# Altium footprint library Connectors THD.PcbLib: 631 footprints (part 12 of 46) (continued)
## ERNI_004500 [mm] "Connector; DIN 41612, Type R/3, Thru-Hole; Rows a+b+c, 30 Male Contacts"
height 11.5
pads (32):
  round 1.5 hole 1: a1(0,0) a2(0,-2.54) a3(0,-5.08) a4(0,-7.62) a5(0,-10.16) a6(0,-12.7) a7(0,-15.24) a8(0,-17.78) a9(0,-20.32) a10(0,-22.86) b1(2.54,0) b2(2.54,-2.54) b3(2.54,-5.08) b4(2.54,-7.62) b5(2.54,-10.16) b6(2.54,-12.7) b7(2.54,-15.24) b8(2.54,-17.78) b9(2.54,-20.32) b10(2.54,-22.86) c1(5.08,0) c2(5.08,-2.54) c3(5.08,-5.08) c4(5.08,-7.62) c5(5.08,-10.16) c6(5.08,-12.7) c7(5.08,-15.24) c8(5.08,-17.78) c9(5.08,-20.32) c10(5.08,-22.86)
  round 3.5 / inner round 3.5 / far side round 5.1 hole 2.8: MTG1(2.24,5.95) MTG2(2.24,-28.81)
Top Overlay:
  lines w0.2: -2.96,-27.479 -0.76,-27.479 ; -2.96,4.619 -0.76,4.619 ; -0.76,-31.309 -0.76,-27.479 ; -0.76,-26.679 -2.41,-26.679 ; -0.76,3.819 -2.41,3.819 ; -0.76,8.449 -0.76,4.619 ; 4.39,-26.314 4.39,-25.079 6.89,-25.079 ; 4.39,-25.679 4.99,-25.679 7.49,-25.679 ; 4.39,2.819 4.99,2.819 7.49,2.819 ; 4.39,3.454 4.39,2.219 6.89,2.219 ; 5.24,-31.309 5.24,-27.309 ccw(c4.24,-27.309) 4.24,-26.309 0.24,-26.309 ccw(c0.24,-27.309) -0.76,-27.309 ; 5.24,-27.479 8.04,-27.479 ; 5.24,4.619 8.04,4.619 ; 5.24,8.449 5.24,4.449 cw(c4.24,4.449) 4.24,3.449 0.24,3.449 cw(c0.24,4.449) -0.76,4.449 ; -2.41,-26.679 -1.81,-26.079 ; -2.41,-26.679 -2.41,3.819 ; -2.41,3.819 -1.81,3.219 ; -1.81,-26.079 -0.76,-26.079 -0.76,-27.309 ; -1.81,-26.079 -1.81,3.219 ; -1.81,3.219 -0.76,3.219 -0.76,4.449 ; -0.76,-27.479 -0.76,-27.309 ; -0.76,4.449 -0.76,4.619 ; 6.89,-25.079 6.89,2.219 ; 6.89,-25.079 7.49,-25.679 ; 6.89,2.219 7.49,2.819 ; 7.49,-25.679 7.49,2.819 ; -2.96,-31.309 -2.96,8.449 8.04,8.449 8.04,-31.309 -2.96,-31.309
  text "b" at 2.032,1.524 h1.2
  text "a" at -0.508,1.524 h1.2
  text "5" at -4.174,-10.885 h1.2
  text "10" at -5.172,-23.535 h1.2
  text "1" at -3.839,-0.725 h1.2
Mechanical 8:
  lines w0.1: -1,-22.86 0,-22.86 ; -1,-20.32 0,-20.32 ; -1,-17.78 0,-17.78 ; -1,-15.24 0,-15.24 ; -1,-12.7 0,-12.7 ; -1,-10.16 0,-10.16 ; -1,-7.62 0,-7.62 ; -1,-5.08 0,-5.08 ; -1,-2.54 0,-2.54 ; -1,0 0,0 ; 0,-23.86 0,-22.86 ; 0,-21.86 0,-22.86 ; 0,-21.32 0,-20.32 ; 0,-19.32 0,-20.32 ; 0,-18.78 0,-17.78 ; 0,-16.78 0,-17.78 ; 0,-16.24 0,-15.24 ; 0,-14.24 0,-15.24 ; 0,-13.7 0,-12.7 ; 0,-11.7 0,-12.7 ; 0,-11.16 0,-10.16 ; 0,-9.16 0,-10.16 ; 0,-8.62 0,-7.62 ; 0,-6.62 0,-7.62 ; 0,-6.08 0,-5.08 ; 0,-4.08 0,-5.08 ; 0,-3.54 0,-2.54 ; 0,-1.54 0,-2.54 ; 0,-1 0,0 ; 0,1 0,0 ; 1,-22.86 0,-22.86 ; 1,-20.32 0,-20.32 ; 1,-17.78 0,-17.78 ; 1,-15.24 0,-15.24 ; 1,-12.7 0,-12.7 ; 1,-10.16 0,-10.16 ; 1,-7.62 0,-7.62 ; 1,-5.08 0,-5.08 ; 1,-2.54 0,-2.54 ; 1,0 0,0 ; 1.24,-28.81 2.24,-28.81 ; 1.24,5.95 2.24,5.95 ; 1.54,-22.86 2.54,-22.86 ; 1.54,-20.32 2.54,-20.32 ; 1.54,-17.78 2.54,-17.78 ; 1.54,-15.24 2.54,-15.24 ; 1.54,-12.7 2.54,-12.7 ; 1.54,-10.16 2.54,-10.16 ; 1.54,-7.62 2.54,-7.62 ; 1.54,-5.08 2.54,-5.08 ; 1.54,-2.54 2.54,-2.54 ; 1.54,0 2.54,0 ; 2.24,-29.81 2.24,-28.81 ; 2.24,-27.81 2.24,-28.81 ; 2.24,4.95 2.24,5.95 ; 2.24,6.95 2.24,5.95 ; 2.54,-23.86 2.54,-22.86 ; 2.54,-21.86 2.54,-22.86 ; 2.54,-21.32 2.54,-20.32 ; 2.54,-19.32 2.54,-20.32 ; 2.54,-18.78 2.54,-17.78 ; 2.54,-16.78 2.54,-17.78 ; 2.54,-16.24 2.54,-15.24 ; 2.54,-14.24 2.54,-15.24 ; 2.54,-13.7 2.54,-12.7 ; 2.54,-11.7 2.54,-12.7 ; 2.54,-11.16 2.54,-10.16 ; 2.54,-9.16 2.54,-10.16 ; 2.54,-8.62 2.54,-7.62 ; 2.54,-6.62 2.54,-7.62 ; 2.54,-6.08 2.54,-5.08 ; 2.54,-4.08 2.54,-5.08 ; 2.54,-3.54 2.54,-2.54 ; 2.54,-1.54 2.54,-2.54 ; 2.54,-1 2.54,0 ; 2.54,1 2.54,0 ; 3.24,-28.81 2.24,-28.81 ; 3.24,5.95 2.24,5.95 ; 3.54,-22.86 2.54,-22.86 ; 3.54,-20.32 2.54,-20.32 ; 3.54,-17.78 2.54,-17.78 ; 3.54,-15.24 2.54,-15.24 ; 3.54,-12.7 2.54,-12.7 ; 3.54,-10.16 2.54,-10.16 ; 3.54,-7.62 2.54,-7.62 ; 3.54,-5.08 2.54,-5.08 ; 3.54,-2.54 2.54,-2.54 ; 3.54,0 2.54,0 ; 4.08,-22.86 5.08,-22.86 ; 4.08,-20.32 5.08,-20.32 ; 4.08,-17.78 5.08,-17.78 ; 4.08,-15.24 5.08,-15.24 ; 4.08,-12.7 5.08,-12.7 ; 4.08,-10.16 5.08,-10.16 ; 4.08,-7.64 5.08,-7.64 ; 4.08,-5.08 5.08,-5.08 ; 4.08,-2.54 5.08,-2.54 ; 4.08,0 5.08,0 ; 5.08,-23.86 5.08,-22.86 ; 5.08,-21.86 5.08,-22.86 ; 5.08,-21.32 5.08,-20.32 ; 5.08,-19.32 5.08,-20.32 ; 5.08,-18.78 5.08,-17.78 ; 5.08,-16.78 5.08,-17.78 ; 5.08,-16.24 5.08,-15.24 ; 5.08,-14.24 5.08,-15.24 ; 5.08,-13.7 5.08,-12.7 ; 5.08,-11.7 5.08,-12.7 ; 5.08,-11.16 5.08,-10.16 ; 5.08,-9.16 5.08,-10.16 ; 5.08,-8.64 5.08,-7.64 ; 5.08,-6.64 5.08,-7.64 ; 5.08,-6.08 5.08,-5.08 ; 5.08,-4.08 5.08,-5.08 ; 5.08,-3.54 5.08,-2.54 ; 5.08,-1.54 5.08,-2.54 ; 5.08,-1 5.08,0 ; 5.08,1 5.08,0 ; 6.08,-22.86 5.08,-22.86 ; 6.08,-20.32 5.08,-20.32 ; 6.08,-17.78 5.08,-17.78 ; 6.08,-15.24 5.08,-15.24 ; 6.08,-12.7 5.08,-12.7 ; 6.08,-10.16 5.08,-10.16 ; 6.08,-7.64 5.08,-7.64 ; 6.08,-5.08 5.08,-5.08 ; 6.08,-2.54 5.08,-2.54 ; 6.08,0 5.08,0
Mechanical 14:
  circle w0.1: c2.24,5.949 r1.4
  circle w0.1: c2.24,-28.809 r1.4
  lines w0.1: -2.96,-27.479 -0.76,-27.479 ; -2.96,4.619 -0.76,4.619 ; -0.76,-31.309 -0.76,-27.479 ; -0.76,-26.679 -2.41,-26.679 ; -0.76,3.819 -2.41,3.819 ; -0.76,8.449 -0.76,4.619 ; 4.39,-26.314 4.39,-25.079 6.89,-25.079 ; 4.39,-25.679 4.99,-25.679 7.49,-25.679 ; 4.39,2.819 4.99,2.819 7.49,2.819 ; 4.39,3.454 4.39,2.219 6.89,2.219 ; 5.24,-31.309 5.24,-27.309 ccw(c4.24,-27.309) 4.24,-26.309 0.24,-26.309 ccw(c0.24,-27.309) -0.76,-27.309 ; 5.24,-27.479 8.04,-27.479 ; 5.24,4.619 8.04,4.619 ; 5.24,8.449 5.24,4.449 cw(c4.24,4.449) 4.24,3.449 0.24,3.449 cw(c0.24,4.449) -0.76,4.449 ; -2.41,-26.679 -1.81,-26.079 ; -2.41,-26.679 -2.41,3.819 ; -2.41,3.819 -1.81,3.219 ; -1.81,-26.079 -0.76,-26.079 -0.76,-27.309 ; -1.81,-26.079 -1.81,3.219 ; -1.81,3.219 -0.76,3.219 -0.76,4.449 ; -0.76,-27.479 -0.76,-27.309 ; -0.76,4.449 -0.76,4.619 ; 6.89,-25.079 6.89,2.219 ; 6.89,-25.079 7.49,-25.679 ; 6.89,2.219 7.49,2.819 ; 7.49,-25.679 7.49,2.819 ; -2.96,-31.309 -2.96,8.449 8.04,8.449 8.04,-31.309 -2.96,-31.309
  text "b" at 2.032,1.524 h1.2
  text "a" at -0.508,1.524 h1.2
  text "10" at -5.172,-23.535 h1.2
  text "1" at -3.839,-0.725 h1.2
  text "5" at -4.174,-10.885 h1.2
3D body: height 11.6, standoff -4.5, extent -2.96,-31.308 8.04,8.449

## ERNI_214443 [mm] "40+4 Contacts, 5 Rows  (a,b,c,d,e) of 8 positions + 1 Shield Row (f) of  4 Positions, Pitch 2 mm,  Press-Fit, Right Angle Ermet B8 CompactPCI Express Female Connector"
height 11.4
pads (44):
  round 1.1 hole 0.6: a1(4,7) a2(4,5) a3(4,3) a4(4,1) a5(4,-1) a6(4,-3) a7(4,-5) a8(4,-7) b1(2,7) b2(2,5) b3(2,3) b4(2,1) b5(2,-1) b6(2,-3) b7(2,-5) b8(2,-7) c1(0,7) c2(0,5) c3(0,3) c4(0,1) c5(0,-1) c6(0,-3) c7(0,-5) c8(0,-7) d1(-2,7) d2(-2,5) d3(-2,3) d4(-2,1) d5(-2,-1) d6(-2,-3) d7(-2,-5) d8(-2,-7) e1(-4,7) e2(-4,5) e3(-4,3) e4(-4,1) e5(-4,-1) e6(-4,-3) e7(-4,-5) e8(-4,-7) f1(-6,7) f3(-6,3) f5(-6,-1) f7(-6,-5)
Top Overlay:
  lines w0.2: -6.109,-5.944 -6.109,-7.915 -4.515,-7.915 ; -6.109,-4.056 -6.109,-1.944 ; -6.109,-0.056 -6.109,2.056 ; -6.109,3.944 -6.109,6.056 ; -5.849,-7.915 -5.849,-8 14.801,-8 14.801,8 -5.849,8 -5.849,7.915 ; -5.744,7.915 -4.515,7.915 ; -5.689,-7.915 -5.689,-5.898 ; -5.689,-4.102 -5.689,-1.898 ; -5.689,-0.102 -5.689,2.102 ; -5.689,3.898 -5.689,6.102 ; -5.689,7.898 -5.689,7.915 ; 4.515,-7.915 13.601,-7.915 13.601,-6.365 cw(c13.751,-6.365) 13.738,-6.216 14.218,-6.215 14.218,-5.715 13.751,-5.715 cw(c13.751,-5.565) 13.601,-5.565 13.601,-0.365 cw(c13.751,-0.365) 13.751,-0.215 14.218,-0.215 14.218,0.285 13.751,0.285 cw(c13.751,0.435) 13.601,0.435 13.601,5.635 cw(c13.751,5.635) 13.751,5.785 14.218,5.785 14.218,6.285 13.751,6.285 cw(c13.751,6.435) 13.601,6.435 13.601,7.915 4.515,7.915 ; 8.423,-7.49 ccw(c8.548,-7.49) 8.548,-7.615 12.701,-7.615 ccw(c12.701,-7.215) 13.101,-7.215 13.101,-6.715 ccw(c12.701,-6.715) 12.701,-6.315 8.548,-6.315 ccw(c8.548,-6.44) 8.423,-6.44 8.423,-6.565 12.701,-6.565 12.701,-7.365 8.423,-7.365 8.423,-7.49 ; 8.423,-5.49 ccw(c8.548,-5.49) 8.548,-5.615 12.701,-5.615 ccw(c12.701,-5.215) 13.101,-5.215 13.101,-4.715 ccw(c12.701,-4.715) 12.701,-4.315 8.548,-4.315 ccw(c8.548,-4.44) 8.423,-4.44 8.423,-4.565 12.701,-4.565 12.701,-5.365 8.423,-5.365 8.423,-5.49 ; 8.423,-3.49 ccw(c8.548,-3.49) 8.548,-3.615 12.701,-3.615 ccw(c12.701,-3.215) 13.101,-3.215 13.101,-2.715 ccw(c12.701,-2.715) 12.701,-2.315 8.548,-2.315 ccw(c8.548,-2.44) 8.423,-2.44 8.423,-2.565 12.701,-2.565 12.701,-3.365 8.423,-3.365 8.423,-3.49 ; 8.423,-1.49 ccw(c8.548,-1.49) 8.548,-1.615 12.701,-1.615 ccw(c12.701,-1.215) 13.101,-1.215 13.101,-0.715 ccw(c12.701,-0.715) 12.701,-0.315 8.548,-0.315 ccw(c8.548,-0.44) 8.423,-0.44 8.423,-0.565 12.701,-0.565 12.701,-1.365 8.423,-1.365 8.423,-1.49 ; 8.423,0.51 ccw(c8.548,0.51) 8.548,0.385 12.701,0.385 ccw(c12.701,0.785) 13.101,0.785 13.101,1.285 ccw(c12.701,1.285) 12.701,1.685 8.548,1.685 ccw(c8.548,1.56) 8.423,1.56 8.423,1.435 12.701,1.435 12.701,0.635 8.423,0.635 8.423,0.51 ; 8.423,2.51 ccw(c8.548,2.51) 8.548,2.385 12.701,2.385 ccw(c12.701,2.785) 13.101,2.785 13.101,3.285 ccw(c12.701,3.285) 12.701,3.685 8.548,3.685 ccw(c8.548,3.56) 8.423,3.56 8.423,3.435 12.701,3.435 12.701,2.635 8.423,2.635 8.423,2.51 ; 8.423,4.51 ccw(c8.548,4.51) 8.548,4.385 12.701,4.385 ccw(c12.701,4.785) 13.101,4.785 13.101,5.285 ccw(c12.701,5.285) 12.701,5.685 8.548,5.685 ccw(c8.548,5.56) 8.423,5.56 8.423,5.435 12.701,5.435 12.701,4.635 8.423,4.635 8.423,4.51 ; 8.423,6.51 ccw(c8.548,6.51) 8.548,6.385 12.701,6.385 ccw(c12.701,6.785) 13.101,6.785 13.101,7.285 ccw(c12.701,7.285) 12.701,7.685 8.548,7.685 ccw(c8.548,7.56) 8.423,7.56 8.423,7.435 12.701,7.435 12.701,6.635 8.423,6.635 8.423,6.51
  text "1" at -7.475,6.35 h1.2
  text "8" at -7.95,-7.6 h1.2
Mechanical 8:
  drawing of 180 lines, arcs and shapes, not listed
Mechanical 14:
  lines w0.1: -5.849,-7.915 -5.849,-8 14.801,-8 14.801,8 -5.849,8 -5.849,7.915 ; -5.689,-7.915 -5.689,7.915 ; -6.109,-7.915 -6.109,7.915 13.601,7.915 13.601,6.435 ccw(c13.751,6.435) 13.751,6.285 14.218,6.285 14.218,5.785 13.751,5.785 ccw(c13.751,5.635) 13.601,5.635 13.601,0.435 ccw(c13.751,0.435) 13.751,0.285 14.218,0.285 14.218,-0.215 13.751,-0.215 ccw(c13.751,-0.365) 13.601,-0.365 13.601,-5.565 ccw(c13.751,-5.565) 13.751,-5.715 14.218,-5.715 14.218,-6.215 13.738,-6.216 ccw(c13.751,-6.365) 13.601,-6.365 13.601,-7.915 -6.109,-7.915 ; 8.423,-7.49 ccw(c8.548,-7.49) 8.548,-7.615 12.701,-7.615 ccw(c12.701,-7.215) 13.101,-7.215 13.101,-6.715 ccw(c12.701,-6.715) 12.701,-6.315 8.548,-6.315 ccw(c8.548,-6.44) 8.423,-6.44 8.423,-6.565 12.701,-6.565 12.701,-7.365 8.423,-7.365 8.423,-7.49 ; 8.423,-5.49 ccw(c8.548,-5.49) 8.548,-5.615 12.701,-5.615 ccw(c12.701,-5.215) 13.101,-5.215 13.101,-4.715 ccw(c12.701,-4.715) 12.701,-4.315 8.548,-4.315 ccw(c8.548,-4.44) 8.423,-4.44 8.423,-4.565 12.701,-4.565 12.701,-5.365 8.423,-5.365 8.423,-5.49 ; 8.423,-3.49 ccw(c8.548,-3.49) 8.548,-3.615 12.701,-3.615 ccw(c12.701,-3.215) 13.101,-3.215 13.101,-2.715 ccw(c12.701,-2.715) 12.701,-2.315 8.548,-2.315 ccw(c8.548,-2.44) 8.423,-2.44 8.423,-2.565 12.701,-2.565 12.701,-3.365 8.423,-3.365 8.423,-3.49 ; 8.423,-1.49 ccw(c8.548,-1.49) 8.548,-1.615 12.701,-1.615 ccw(c12.701,-1.215) 13.101,-1.215 13.101,-0.715 ccw(c12.701,-0.715) 12.701,-0.315 8.548,-0.315 ccw(c8.548,-0.44) 8.423,-0.44 8.423,-0.565 12.701,-0.565 12.701,-1.365 8.423,-1.365 8.423,-1.49 ; 8.423,0.51 ccw(c8.548,0.51) 8.548,0.385 12.701,0.385 ccw(c12.701,0.785) 13.101,0.785 13.101,1.285 ccw(c12.701,1.285) 12.701,1.685 8.548,1.685 ccw(c8.548,1.56) 8.423,1.56 8.423,1.435 12.701,1.435 12.701,0.635 8.423,0.635 8.423,0.51 ; 8.423,2.51 ccw(c8.548,2.51) 8.548,2.385 12.701,2.385 ccw(c12.701,2.785) 13.101,2.785 13.101,3.285 ccw(c12.701,3.285) 12.701,3.685 8.548,3.685 ccw(c8.548,3.56) 8.423,3.56 8.423,3.435 12.701,3.435 12.701,2.635 8.423,2.635 8.423,2.51 ; 8.423,4.51 ccw(c8.548,4.51) 8.548,4.385 12.701,4.385 ccw(c12.701,4.785) 13.101,4.785 13.101,5.285 ccw(c12.701,5.285) 12.701,5.685 8.548,5.685 ccw(c8.548,5.56) 8.423,5.56 8.423,5.435 12.701,5.435 12.701,4.635 8.423,4.635 8.423,4.51 ; 8.423,6.51 ccw(c8.548,6.51) 8.548,6.385 12.701,6.385 ccw(c12.701,6.785) 13.101,6.785 13.101,7.285 ccw(c12.701,7.285) 12.701,7.685 8.548,7.685 ccw(c8.548,7.56) 8.423,7.56 8.423,7.435 12.701,7.435 12.701,6.635 8.423,6.635 8.423,6.51
  text "1" at -7.475,6.35 h1.2
  text "8" at -7.95,-7.6 h1.2
Drill Drawing:
  lines w0.1: -6.975,-8 -6.975,8 4.9,8 4.9,-8 -6.975,-8
  text "PRESS-FIT TECHNOLOGY" at 6.575,-8.45 h1
  text "diam. 0.6mm +/-0.05" at 8.175,-8.15 h1
3D body: height 8.09, standoff -3.7, extent -6.109,-8.8 14.801,8

## ERNI_233230 [mm] "DIN 41612, Type H, 11 Positions, Right Angle Male Connector, Pitch 7.62 mm, With Early Make Last Break Contacts"
height 11.1
pads (13):
  round 2.3 hole 1.6: 2(0,0) 5(0,-7.62) 8(0,-15.24) 11(0,-22.86) 14(0,-30.48) 17(0,-38.1) 20(0,-45.72) 23(0,-53.34) 26(0,-60.96) 29(0,-68.58) 32(0,-76.2)
  round 3.5 / inner round 3.5 / far side round 5.1 hole 2.8: MTG1(12.7,7.62) MTG2(12.7,-81.28)
Top Overlay:
  lines w0.2: 10.3,-82.568 10.3,-83.83 17.6,-83.83 17.6,-80.83 27,-80.83 27,7.17 17.6,7.17 17.6,10.17 10.3,10.17 10.3,8.907 ; 10.3,-80.043 10.3,-78.78 ; 10.3,5.12 10.3,6.382 ; 11.5,-78.78 -1.6,-78.78 -1.6,5.12 11.5,5.12 ; 14,-78.78 15.7,-78.78 15.7,-83.83 ; 14,5.12 15.7,5.12 15.7,10.17 ; 27,-66.1 25.3,-66.1 25.3,-65.05 27,-65.05 ; 27,-61.95 25.3,-61.95 25.3,-60.9 27,-60.9 ; 27,-50.86 25.3,-50.86 25.3,-49.81 27,-49.81 ; 27,-46.71 25.3,-46.71 25.3,-45.66 27,-45.66 ; 27,-35.62 25.3,-35.62 25.3,-34.57 27,-34.57 ; 27,-31.47 25.3,-31.47 25.3,-30.42 27,-30.42 ; 27,-20.38 25.3,-20.38 25.3,-19.33 27,-19.33 ; 27,-16.23 25.3,-16.23 25.3,-15.18 27,-15.18
  text "2" at -3.145,-0.635 h1.2
  text "5" at -3.145,-8.255 h1.2
  text "8" at -3.145,-15.875 h1.2
  text "11" at -3.78,-23.495 h1.2
  text "14" at -3.78,-31.115 h1.2
  text "17" at -3.78,-38.735 h1.2
  text "20" at -3.78,-46.355 h1.2
  text "23" at -3.78,-53.975 h1.2
  text "26" at -3.78,-61.595 h1.2
  text "29" at -3.78,-69.215 h1.2
  text "32" at -3.78,-76.835 h1.2
Mechanical 8:
  circle w0.2: c0,0 r0.8
  circle w0.2: c0,-7.62 r0.8
  circle w0.2: c0,-15.24 r0.8
  circle w0.2: c0,-22.86 r0.8
  circle w0.2: c0,-30.48 r0.8
  circle w0.2: c0,-38.1 r0.8
  circle w0.2: c0,-45.72 r0.8
  circle w0.2: c0,-53.34 r0.8
  circle w0.2: c12.7,7.62 r1.4
  circle w0.2: c0,-60.96 r0.8
  circle w0.2: c0,-68.58 r0.8
  circle w0.2: c12.7,-81.28 r1.4
  circle w0.2: c0,-76.2 r0.8
  lines w0.2: 0,-77.4 0,-76.2 1.2,-76.2 ; 0,-69.78 0,-68.58 1.2,-68.58 ; 0,-62.16 0,-60.96 1.2,-60.96 ; 0,-54.54 0,-53.34 1.2,-53.34 ; 0,-46.92 0,-45.72 1.2,-45.72 ; 0,-39.3 0,-38.1 1.2,-38.1 ; 0,-31.68 0,-30.48 1.2,-30.48 ; 0,-24.06 0,-22.86 1.2,-22.86 ; 0,-16.44 0,-15.24 1.2,-15.24 ; 0,-8.82 0,-7.62 1.2,-7.62 ; 0,-1.2 0,0 1.2,0 ; 10.795,-36.83 12.7,-36.83 12.7,-38.735 ; 12.7,-83.38 12.7,-81.28 14.8,-81.28 ; 12.7,5.52 12.7,7.62 14.8,7.62 ; 15,-83.83 15,-40.005 ; 15,-33.655 15,10.17
  text "PCB" at 15.875,-38.735 h1.5
Mechanical 14:
  lines w0.1: 10.3,-78.78 10.3,-83.83 17.6,-83.83 17.6,-80.83 27,-80.83 27,7.17 17.6,7.17 17.6,10.17 10.3,10.17 10.3,5.12 ; 15.7,-83.83 15.7,-78.78 -1.6,-78.78 -1.6,5.12 15.7,5.12 15.7,10.17 ; 27,-66.1 25.3,-66.1 25.3,-65.05 27,-65.05 ; 27,-61.95 25.3,-61.95 25.3,-60.9 27,-60.9 ; 27,-50.86 25.3,-50.86 25.3,-49.81 27,-49.81 ; 27,-46.71 25.3,-46.71 25.3,-45.66 27,-45.66 ; 27,-35.62 25.3,-35.62 25.3,-34.57 27,-34.57 ; 27,-31.47 25.3,-31.47 25.3,-30.42 27,-30.42 ; 27,-20.38 25.3,-20.38 25.3,-19.33 27,-19.33 ; 27,-16.23 25.3,-16.23 25.3,-15.18 27,-15.18
3D body: height 9.5, standoff -3.5, extent -1.6,-83.83 27,10.17

## ERNI_254320 [mm] "Connector; DIN 41612, Type C/3, Thru-Hole; Rows a+b+c, 30 Female Contacts"
height 11.6
pads (32):
  round 1.5 hole 1: a1(0,0) a2(0,-2.54) a3(0,-5.08) a4(0,-7.62) a5(0,-10.16) a6(0,-12.7) a7(0,-15.24) a8(0,-17.78) a9(0,-20.32) a10(0,-22.86) b1(2.54,0) b2(2.54,-2.54) b3(2.54,-5.08) b4(2.54,-7.62) b5(2.54,-10.16) b6(2.54,-12.7) b7(2.54,-15.24) b8(2.54,-17.78) b9(2.54,-20.32) b10(2.54,-22.86) c1(5.08,0) c2(5.08,-2.54) c3(5.08,-5.08) c4(5.08,-7.62) c5(5.08,-10.16) c6(5.08,-12.7) c7(5.08,-15.24) c8(5.08,-17.78) c9(5.08,-20.32) c10(5.08,-22.86)
  round 3.5 / inner round 3.5 / far side round 5.1 hole 2.8: MTG1(2.24,5.95) MTG2(2.24,-28.81)
Top Overlay:
  lines w0.2: -2.71,-29.139 -2.71,-28.996 -2.71,-28.643 -2.71,-28.5 ; -1.597,-25.872 -1.035,-25.31 ; -1.597,3.012 -1.035,2.45 ; -1.035,-23.6 -1.035,-25.31 ; -1.035,0.74 -1.035,2.45 ; -0.76,-31.23 -0.76,-26.96 cw(c0.24,-26.96) 0.24,-25.96 ; -0.76,8.37 -0.76,4.1 ccw(c0.24,4.1) 0.24,3.1 ; -0.485,-25.31 -1.035,-25.31 ; -0.485,2.45 -1.035,2.45 ; 1.08,-31.23 -2.41,-31.23 cw(c-2.41,-30.93) -2.71,-30.93 -2.71,8.07 cw(c-2.41,8.07) -2.41,8.37 1.08,8.37 ; 2.665,-25.96 2.665,-24.96 -0.485,-24.96 -0.485,-25.96 ; 2.665,-25.31 3.215,-25.31 ; 2.665,2.45 3.215,2.45 ; 2.665,3.1 2.665,2.1 -0.485,2.1 -0.485,3.1 ; 3.565,-25.96 ccw(c3.565,-25.66) 3.865,-25.66 3.865,-24.91 ; 3.565,3.1 cw(c3.565,2.8) 3.865,2.8 3.865,2.05 ; 3.777,-25.872 3.215,-25.31 ; 3.777,3.012 3.215,2.45 ; 4,-31.23 7.49,-31.23 ccw(c7.49,-30.93) 7.79,-30.93 7.79,8.07 ccw(c7.49,8.07) 7.49,8.37 4,8.37 ; 5.24,-31.23 5.24,-26.96 ccw(c4.24,-26.96) 4.24,-25.96 0.24,-25.96 ; 5.24,8.37 5.24,4.1 cw(c4.24,4.1) 4.24,3.1 0.24,3.1 ; 6.115,-23.425 6.115,-24.26 ; 6.115,0.565 6.115,1.4 ; 6.677,-24.822 6.115,-24.26 ; 6.677,1.962 6.115,1.4 ; 7.79,-29.139 7.79,-28.643 ; 7.79,5.64 7.79,5.783 ; -0.485,-25.96 0.24,-25.96 ; -0.485,-25.96 -1.385,-25.96 cw(c-1.385,-25.66) -1.685,-25.66 -1.685,-22.11 -1.685,-0.75 -1.685,2.8 cw(c-1.385,2.8) -1.385,3.1 -0.485,3.1 ; -0.485,3.1 0.24,3.1 ; 3.215,-25.31 3.215,-24.26 ; 3.215,-24.26 6.115,-24.26 ; 3.215,-24.26 3.865,-24.91 ; 3.215,1.4 6.115,1.4 ; 3.215,1.4 3.215,2.45 ; 3.215,1.4 3.865,2.05 ; 3.865,-24.91 6.465,-24.91 ccw(c6.465,-24.61) 6.765,-24.61 6.765,-22.11 6.765,-0.75 6.765,1.75 ccw(c6.465,1.75) 6.465,2.05 3.865,2.05
  text "c" at 5.715,3.81 h1.2
  text "a" at -2.286,3.81 h1.2
  text "1" at -3.585,-0.725 h1.2
  text "5" at -3.92,-10.885 h1.2
  text "10" at -4.918,-23.535 h1.2
Mechanical 8:
  lines w0.1: -1,-22.86 0,-22.86 ; -1,-20.32 0,-20.32 ; -1,-17.78 0,-17.78 ; -1,-15.24 0,-15.24 ; -1,-12.7 0,-12.7 ; -1,-10.16 0,-10.16 ; -1,-7.62 0,-7.62 ; -1,-5.08 0,-5.08 ; -1,-2.54 0,-2.54 ; -1,0 0,0 ; 0,-23.86 0,-22.86 ; 0,-21.86 0,-22.86 ; 0,-21.32 0,-20.32 ; 0,-19.32 0,-20.32 ; 0,-18.78 0,-17.78 ; 0,-16.78 0,-17.78 ; 0,-16.24 0,-15.24 ; 0,-14.24 0,-15.24 ; 0,-13.7 0,-12.7 ; 0,-11.7 0,-12.7 ; 0,-11.16 0,-10.16 ; 0,-9.16 0,-10.16 ; 0,-8.62 0,-7.62 ; 0,-6.62 0,-7.62 ; 0,-6.08 0,-5.08 ; 0,-4.08 0,-5.08 ; 0,-3.54 0,-2.54 ; 0,-1.54 0,-2.54 ; 0,-1 0,0 ; 0,1 0,0 ; 1,-22.86 0,-22.86 ; 1,-20.32 0,-20.32 ; 1,-17.78 0,-17.78 ; 1,-15.24 0,-15.24 ; 1,-12.7 0,-12.7 ; 1,-10.16 0,-10.16 ; 1,-7.62 0,-7.62 ; 1,-5.08 0,-5.08 ; 1,-2.54 0,-2.54 ; 1,0 0,0 ; 1.24,-28.81 2.24,-28.81 ; 1.24,5.95 2.24,5.95 ; 1.54,-22.86 2.54,-22.86 ; 1.54,-20.32 2.54,-20.32 ; 1.54,-17.78 2.54,-17.78 ; 1.54,-15.24 2.54,-15.24 ; 1.54,-12.7 2.54,-12.7 ; 1.54,-10.16 2.54,-10.16 ; 1.54,-7.62 2.54,-7.62 ; 1.54,-5.08 2.54,-5.08 ; 1.54,-2.54 2.54,-2.54 ; 1.54,0 2.54,0 ; 2.24,-29.81 2.24,-28.81 ; 2.24,-27.81 2.24,-28.81 ; 2.24,4.95 2.24,5.95 ; 2.24,6.95 2.24,5.95 ; 2.54,-23.86 2.54,-22.86 ; 2.54,-21.86 2.54,-22.86 ; 2.54,-21.32 2.54,-20.32 ; 2.54,-19.32 2.54,-20.32 ; 2.54,-18.78 2.54,-17.78 ; 2.54,-16.78 2.54,-17.78 ; 2.54,-16.24 2.54,-15.24 ; 2.54,-14.24 2.54,-15.24 ; 2.54,-13.7 2.54,-12.7 ; 2.54,-11.7 2.54,-12.7 ; 2.54,-11.16 2.54,-10.16 ; 2.54,-9.16 2.54,-10.16 ; 2.54,-8.62 2.54,-7.62 ; 2.54,-6.62 2.54,-7.62 ; 2.54,-6.08 2.54,-5.08 ; 2.54,-4.08 2.54,-5.08 ; 2.54,-3.54 2.54,-2.54 ; 2.54,-1.54 2.54,-2.54 ; 2.54,-1 2.54,0 ; 2.54,1 2.54,0 ; 3.24,-28.81 2.24,-28.81 ; 3.24,5.95 2.24,5.95 ; 3.54,-22.86 2.54,-22.86 ; 3.54,-20.32 2.54,-20.32 ; 3.54,-17.78 2.54,-17.78 ; 3.54,-15.24 2.54,-15.24 ; 3.54,-12.7 2.54,-12.7 ; 3.54,-10.16 2.54,-10.16 ; 3.54,-7.62 2.54,-7.62 ; 3.54,-5.08 2.54,-5.08 ; 3.54,-2.54 2.54,-2.54 ; 3.54,0 2.54,0 ; 4.08,-22.86 5.08,-22.86 ; 4.08,-20.32 5.08,-20.32 ; 4.08,-17.78 5.08,-17.78 ; 4.08,-15.24 5.08,-15.24 ; 4.08,-12.7 5.08,-12.7 ; 4.08,-10.16 5.08,-10.16 ; 4.08,-7.64 5.08,-7.64 ; 4.08,-5.08 5.08,-5.08 ; 4.08,-2.54 5.08,-2.54 ; 4.08,0 5.08,0 ; 5.08,-23.86 5.08,-22.86 ; 5.08,-21.86 5.08,-22.86 ; 5.08,-21.32 5.08,-20.32 ; 5.08,-19.32 5.08,-20.32 ; 5.08,-18.78 5.08,-17.78 ; 5.08,-16.78 5.08,-17.78 ; 5.08,-16.24 5.08,-15.24 ; 5.08,-14.24 5.08,-15.24 ; 5.08,-13.7 5.08,-12.7 ; 5.08,-11.7 5.08,-12.7 ; 5.08,-11.16 5.08,-10.16 ; 5.08,-9.16 5.08,-10.16 ; 5.08,-8.64 5.08,-7.64 ; 5.08,-6.64 5.08,-7.64 ; 5.08,-6.08 5.08,-5.08 ; 5.08,-4.08 5.08,-5.08 ; 5.08,-3.54 5.08,-2.54 ; 5.08,-1.54 5.08,-2.54 ; 5.08,-1 5.08,0 ; 5.08,1 5.08,0 ; 6.08,-22.86 5.08,-22.86 ; 6.08,-20.32 5.08,-20.32 ; 6.08,-17.78 5.08,-17.78 ; 6.08,-15.24 5.08,-15.24 ; 6.08,-12.7 5.08,-12.7 ; 6.08,-10.16 5.08,-10.16 ; 6.08,-7.64 5.08,-7.64 ; 6.08,-5.08 5.08,-5.08 ; 6.08,-2.54 5.08,-2.54 ; 6.08,0 5.08,0
Mechanical 14:
  circle w0.1: c2.24,5.95 r1.425
  circle w0.1: c2.24,-28.81 r1.425
  lines w0.1: -2.71,-29.139 -2.71,-28.996 -2.71,-28.643 -2.71,-28.5 ; -1.597,-25.872 -1.035,-25.31 ; -1.597,3.012 -1.035,2.45 ; -0.76,-31.23 -0.76,-26.96 cw(c0.24,-26.96) 0.24,-25.96 ; -0.76,8.37 -0.76,4.1 ccw(c0.24,4.1) 0.24,3.1 ; -0.485,-25.31 -1.035,-25.31 ; -0.485,2.45 -1.035,2.45 ; 0.065,-28.81 4.415,-28.81 ; 0.065,5.95 4.415,5.95 ; 2.24,-30.985 2.24,-26.635 ; 2.24,3.775 2.24,8.125 ; 2.665,-25.96 2.665,-24.96 -0.485,-24.96 -0.485,-25.96 ; 2.665,-25.31 3.215,-25.31 ; 2.665,2.45 3.215,2.45 ; 2.665,3.1 2.665,2.1 -0.485,2.1 -0.485,3.1 ; 3.565,-25.96 ccw(c3.565,-25.66) 3.865,-25.66 3.865,-24.91 ; 3.565,3.1 cw(c3.565,2.8) 3.865,2.8 3.865,2.05 ; 3.777,-25.872 3.215,-25.31 ; 3.777,3.012 3.215,2.45 ; 5.24,-31.23 5.24,-26.96 ccw(c4.24,-26.96) 4.24,-25.96 0.24,-25.96 ; 5.24,8.37 5.24,4.1 cw(c4.24,4.1) 4.24,3.1 0.24,3.1 ; 6.677,-24.822 6.115,-24.26 ; 6.677,1.962 6.115,1.4 ; 7.79,-29.139 7.79,-28.643 ; 7.79,5.64 7.79,5.783 ; -1.035,-25.31 -1.035,2.45 ; -0.485,-25.96 0.24,-25.96 ; -0.485,-25.96 -1.385,-25.96 cw(c-1.385,-25.66) -1.685,-25.66 -1.685,-22.11 -1.685,-0.75 -1.685,2.8 cw(c-1.385,2.8) -1.385,3.1 -0.485,3.1 ; -0.485,3.1 0.24,3.1 ; 3.215,-25.31 3.215,-24.26 ; 3.215,-24.26 6.115,-24.26 ; 3.215,-24.26 3.865,-24.91 ; 3.215,1.4 6.115,1.4 ; 3.215,1.4 3.215,2.45 ; 3.215,1.4 3.865,2.05 ; 3.865,-24.91 6.465,-24.91 ccw(c6.465,-24.61) 6.765,-24.61 6.765,-22.11 6.765,-0.75 6.765,1.75 ccw(c6.465,1.75) 6.465,2.05 3.865,2.05 ; 6.115,-24.26 6.115,1.4 ; -2.71,-30.93 ccw(c-2.41,-30.93) -2.41,-31.23 7.49,-31.23 ccw(c7.49,-30.93) 7.79,-30.93 7.79,8.07 ccw(c7.49,8.07) 7.49,8.37 -2.41,8.37 ccw(c-2.41,8.07) -2.71,8.07 -2.71,-30.93
  text "c" at 5.715,3.81 h1.2
  text "a" at -2.286,3.81 h1.2
  text "10" at -4.918,-23.535 h1.2
  text "1" at -3.585,-0.725 h1.2
  text "5" at -3.92,-10.885 h1.2
3D body: height 11.6, standoff -4.5, extent -2.71,-31.23 7.79,8.37

## ERNI_284891 [mm] "DIN 41612, Type 2B, Thru-Hole Pressfit Terminations;  Rows a+b, 32 Positions, Performance level 2, Lead 4.5 mm, Pitch 2.54mm, Straight Female Connector"
height 11.6
pads (34):
  round 1.7 hole 1: a1(0,0) a2(0,-2.54) a3(0,-5.08) a4(0,-7.62) a5(0,-10.16) a6(0,-12.7) a7(0,-15.24) a8(0,-17.78) a9(0,-20.32) a10(0,-22.86) a11(0,-25.4) a12(0,-27.94) a13(0,-30.48) a14(0,-33.02) a15(0,-35.56) a16(0,-38.1) b1(2.54,0) b2(2.54,-2.54) b3(2.54,-5.08) b4(2.54,-7.62) b5(2.54,-10.16) b6(2.54,-12.7) b7(2.54,-15.24) b8(2.54,-17.78) b9(2.54,-20.32) b10(2.54,-22.86) b11(2.54,-25.4) b12(2.54,-27.94) b13(2.54,-30.48) b14(2.54,-33.02) b15(2.54,-35.56) b16(2.54,-38.1)
  round 3.5 / inner round 3.5 / far side round 5.1 hole 2.8: MTG1(2.24,5.95) MTG2(2.24,-44.05)
Top Overlay:
  lines w0.2: -2.73,-44.05 -0.71,-44.05 ; -2.73,5.95 -0.71,5.95 ; -1.08,-37.705 -1.08,-40.6 ; -1.08,0.395 -1.08,2.5 ; -0.71,-46.5 -0.71,-44.05 ; -0.71,8.4 -0.71,5.95 ; -0.214,-43.191 -0.71,-44.05 ; -0.214,5.091 -0.71,5.95 ; 0.269,-42.354 0.907,-41.25 3.653,-41.25 4.375,-42.5 5.27,-42.5 ; 0.269,4.254 0.907,3.15 3.025,3.15 ; 1.37,-46.5 -2.73,-46.5 -2.73,8.4 1.37,8.4 ; 3.11,-46.5 5.27,-46.5 5.27,8.4 3.11,8.4 ; 3.62,-38.495 3.62,-39.55 ; 3.62,0.395 3.62,1.45 ; 4.014,3.775 4.375,4.4 5.27,4.4 ; -1.73,-41.25 1.17,-41.25 ; -1.73,-41.25 -1.73,3.15 ; -1.73,-41.25 -1.08,-40.6 ; -1.73,3.15 1.17,3.15 ; -1.73,3.15 -1.08,2.5 ; -1.08,-40.6 0.52,-40.6 ; -1.08,2.5 0.52,2.5 ; 0.52,-40.6 0.52,-39.55 ; 0.52,-40.6 1.17,-41.25 ; 0.52,-39.55 3.62,-39.55 ; 0.52,-39.55 1.17,-40.2 ; 0.52,1.45 0.52,2.5 ; 0.52,1.45 3.62,1.45 ; 0.52,1.45 1.17,2.1 ; 0.52,2.5 1.17,3.15 ; 1.17,-41.25 1.17,-40.2 ; 1.17,-40.2 4.27,-40.2 ; 1.17,2.1 1.17,3.15 ; 1.17,2.1 4.27,2.1 ; 3.62,-39.55 4.27,-40.2 ; 3.62,1.45 4.27,2.1 ; 4.27,-40.2 4.27,2.1
  text "15" at -4.949,-36.13 h1.2
  text "1" at -3.64,-0.625 h1.2
  text "b" at 4.65,2.55 h1.2
  text "a" at -0.275,3.65 h1.2
  text "5" at -3.965,-10.785 h1.2
  text "10" at -4.949,-23.43 h1.2
Mechanical 8:
  lines w0.1: 0,-38.1 0,-37.6 0,-38.1 ; 0,-38.1 0.5,-38.1 0,-38.1 ; 0,-38.1 0,-38.6 0,-38.1 ; 0,-38.1 -0.5,-38.1 0,-38.1 ; 0,0 0,0.5 0,0 ; 0,0 0.5,0 0,0 ; 0,0 0,-0.5 0,0 ; 0,0 -0.5,0 0,0 ; 2.24,-44.05 2.24,-43.55 2.24,-44.05 ; 2.24,-44.05 2.74,-44.05 2.24,-44.05 ; 2.24,-44.05 2.24,-44.55 2.24,-44.05 ; 2.24,-44.05 1.74,-44.05 2.24,-44.05 ; 2.24,5.95 2.24,6.45 2.24,5.95 ; 2.24,5.95 2.74,5.95 2.24,5.95 ; 2.24,5.95 2.24,5.45 2.24,5.95 ; 2.24,5.95 1.74,5.95 2.24,5.95 ; 2.54,-38.1 2.54,-37.6 2.54,-38.1 ; 2.54,-38.1 3.04,-38.1 2.54,-38.1 ; 2.54,-38.1 2.54,-38.6 2.54,-38.1 ; 2.54,-38.1 2.04,-38.1 2.54,-38.1 ; 2.54,0 2.54,0.5 2.54,0 ; 2.54,0 3.04,0 2.54,0 ; 2.54,0 2.54,-0.5 2.54,0 ; 2.54,0 2.04,0 2.54,0
Mechanical 14:
  drawing of 426 lines, arcs and shapes, not listed
  text "15" at -4.949,-36.13 h1.2
  text "10" at -4.949,-23.43 h1.2
  text "5" at -3.965,-10.785 h1.2
  text "a" at -0.275,3.65 h1.2
  text "b" at 4.65,2.55 h1.2
  text "1" at -3.64,-0.625 h1.2
Drill Drawing:
  lines w0.1: -2.73,-39.5 -2.73,1.5 5.27,1.5 5.27,-39.5 -2.73,-39.5
  text "PRESS-FIT TECHNOLOGY diam. 1mm +0.09 -0.06" at -1.325,-37.125 h1
3D body: height 11.6, standoff -4.5, extent -2.73,-46.5 5.27,8.4